# Altium footprint library PCB_Lib_Devzone.PcbLib: 491 footprints (part 26 of 31)
Each footprint in its own frame and in the unit in brackets; x right, y up, seen from the top. Pads: shape width x height; smd on the part's side, far side on the other; paste and mask are expansions set on the pad; w line width, h text height; cw(c..) or ccw(c..) is an arc to the next point about the centre after c.
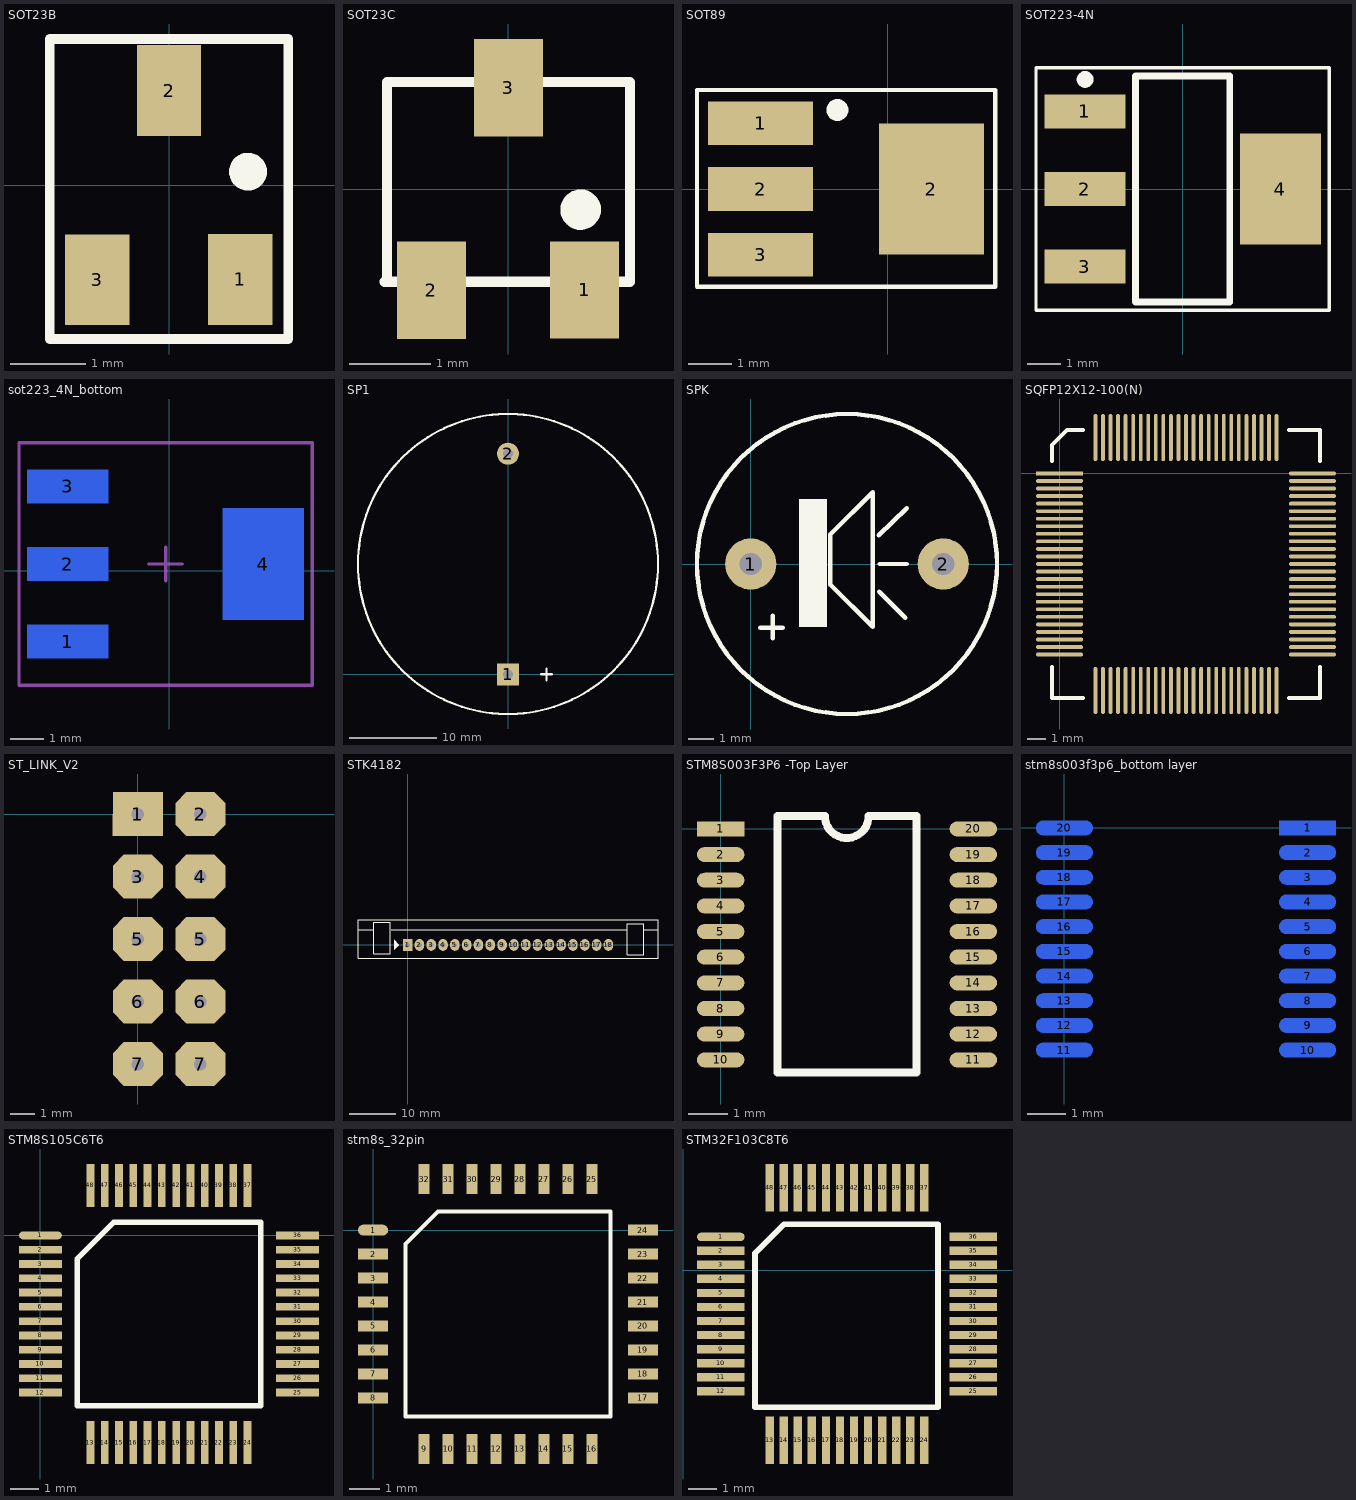
[diagram p25: the footprints below, top view; thin cyan lines are the x and y axes]

## SOT23B [mm] "SOT 23B"
height 1.27
pads (3):
  rect 0.85x1.2 smd: 1(0.94,-1.245) 2(0,1.25) 3(-0.95,-1.25)
Top Overlay:
  circle w0.25: c1.043,0.178 r0.125
  lines w0.127: -1.575,-2.032 1.575,-2.032 1.575,1.93 -1.575,1.93 -1.575,-2.032
3D body "SW3DPS-SOT-23-DEFAULT.STEP": height 1.06, standoff -0.04, extent -1.5,-1.301 1.5,1.199

## SOT23C [mm] "SOT 23C - 2-3-1 - BCE"
height 1.27
pads (3):
  rect 0.85x1.2 smd: 1(0.94,-1.245) 2(-0.95,-1.25) 3(0,1.25)
Top Overlay:
  circle w0.25: c0.891,-0.254 r0.125
  lines w0.127: -1.524,-1.143 1.499,-1.143 1.499,1.321 -1.499,1.321 -1.499,-1.143 -1.524,-1.143
3D body "SW3DPS-SOT-23-DEFAULT.STEP": height 1.06, standoff -0.04, extent -1.5,-1.174 1.5,1.326

## SOT89 [mm] "D882 SOT89 TRANS NPN 3A 30V (SMD)"
pads (4):
  rect 2.4x1 smd: 1(-2.9,1.5) 2(-2.9,0) 3(-2.9,-1.5)
  rect 2.4x3 smd: 2(1,0)
Top Overlay:
  circle w0.25: c-1.143,1.803 r0.125
  lines w0.1: -4.35,-2.235 -4.35,2.261 2.464,2.261 2.464,-2.235 -4.35,-2.235
3D body "User Library-SOT89-3.STEP": height 1.54, standoff 0, extent -2.921,-2.25 1.329,2.25

## SOT223-4N [mm] "SOT223, 4-Leads, Body 6.5x3.5mm, Pitch 2.3mm, Lead Span 7mm, IPC Medium Density"
height 1.8
pads (4):
  rect 2.4x1 smd: 1(-2.9,2.3) 2(-2.9,0) 3(-2.9,-2.3)
  rect 2.4x3.3 smd: 4(2.9,0)
Top Overlay:
  circle w0.25: c-2.894,3.251 r0.125
  lines w0.1: -4.35,-3.6 4.35,-3.6 4.35,3.6 -4.35,3.6 -4.35,-3.6
  lines w0.2: -1.4,-3.35 -1.4,3.35 1.4,3.35 1.4,-3.35 -1.4,-3.35
3D body "SW3dPS-Regulator.STEP": height 1.72, standoff 0.02, extent -3.395,-3.274 3.496,3.226

## sot223_4N_bottom [mm]
pads (4):
  rect 2.4x1 smd far side: 1(-3.002,-2.097) 2(-3.002,0.203) 3(-3.002,2.503)
  rect 2.4x3.3 smd far side: 4(2.798,0.203)
Bottom Overlay:
  circle w0.25: c-3.859,-2.997 r0.125
  lines w0.2: -1.502,-3.147 -1.502,3.553 1.298,3.553 1.298,-3.147 -1.502,-3.147
Mechanical 15:
  lines w0.1: -0.602,0.203 0.398,0.203 ; -0.102,-0.297 -0.102,0.703 ; -4.452,-3.397 -4.452,3.803 4.248,3.803 4.248,-3.397 -4.452,-3.397
3D body "SW3dPS-Regulator.STEP": height -0.53, standoff -2.23, extent -3.496,-2.997 3.395,3.503

## SP1 [mil] "Speaker Telphone on Broad"
height 3
pads (2):
  rect 100x100 hole 45: 1(0,0)
  round 100 hole 45: 2(0,1000)
Top Overlay:
  circle w10: c0,500 r680
  lines w10: 150,0 200,0 ; 174,-28 174,26
3D body "Sonitron-SCS-32 p10-DEFAULT.STEP": height 382.53, standoff -227.75, extent -666.7,-174.54 652.2,1144.36

## SPK [mil] "Speaker Chip"
height 500
pads (2):
  round 80 hole 35: 1(0,0) 2(300,0)
Top Overlay:
  circle w7: c150,0 r233.73
  rectangle: 75,-98 119,101
  lines w7: 15,-99 50,-99 ; 34,-116 34,-81 ; 199.52,44.52 243,87 ; 200,-43 241,-84 ; 201,0 243,0 ; 124,-32 190,-98 190,112 124,46 124,-32
3D body "Sonitron-SCS-17 P10-DEFAULT.STEP": height 343.51, standoff -267.12, extent -221,-354.14 511.28,378.14

## SQFP12X12-100(N) [mm]
pads (100):
  rect 2.5x0.2 smd: 1(0,0)
  oval 2.5x0.2 smd: 2(0,-0.4) 3(0,-0.8) 4(0,-1.2) 5(0,-1.6) 6(0,-2) 7(0,-2.4) 8(0,-2.8) 9(0,-3.2) 10(0,-3.6) 11(0,-4) 12(0,-4.4) 13(0,-4.8) 14(0,-5.2) 15(0,-5.6) 16(0,-6) 17(0,-6.4) 18(0,-6.8) 19(0,-7.2) 20(0,-7.6) 21(0,-8) 22(0,-8.4) 23(0,-8.8) 24(0,-9.2) 25(0,-9.6) 51(13.4,-9.6) 52(13.4,-9.2) 53(13.4,-8.8) 54(13.4,-8.4) 55(13.4,-8) 56(13.4,-7.6) 57(13.4,-7.2) 58(13.4,-6.8) 59(13.4,-6.4) 60(13.4,-6) 61(13.4,-5.6) 62(13.4,-5.2) 63(13.4,-4.8) 64(13.4,-4.4) 65(13.4,-4) 66(13.4,-3.6) 67(13.4,-3.2) 68(13.4,-2.8) 69(13.4,-2.4) 70(13.4,-2) 71(13.4,-1.6) 72(13.4,-1.2) 73(13.4,-0.8) 74(13.4,-0.4) 75(13.4,0)
  oval 0.2x2.5 smd: 26(1.9,-11.5) 27(2.3,-11.5) 28(2.7,-11.5) 29(3.1,-11.5) 30(3.5,-11.5) 31(3.9,-11.5) 32(4.3,-11.5) 33(4.7,-11.5) 34(5.1,-11.5) 35(5.5,-11.5) 36(5.9,-11.5) 37(6.3,-11.5) 38(6.7,-11.5) 39(7.1,-11.5) 40(7.5,-11.5) 41(7.9,-11.5) 42(8.3,-11.5) 43(8.7,-11.5) 44(9.1,-11.5) 45(9.5,-11.5) 46(9.9,-11.5) 47(10.3,-11.5) 48(10.7,-11.5) 49(11.1,-11.5) 50(11.5,-11.5) 76(11.5,1.9) 77(11.1,1.9) 78(10.7,1.9) 79(10.3,1.9) 80(9.9,1.9) 81(9.5,1.9) 82(9.1,1.9) 83(8.7,1.9) 84(8.3,1.9) 85(7.9,1.9) 86(7.5,1.9) 87(7.1,1.9) 88(6.7,1.9) 89(6.3,1.9) 90(5.9,1.9) 91(5.5,1.9) 92(5.1,1.9) 93(4.7,1.9) 94(4.3,1.9) 95(3.9,1.9) 96(3.5,1.9) 97(3.1,1.9) 98(2.7,1.9) 99(2.3,1.9) 100(1.9,1.9)
Top Overlay:
  lines w0.2: -0.4,-10.25 -0.4,-11.9 1.25,-11.9 ; -0.4,0.65 -0.4,1.5 0.4,2.3 1.25,2.3 ; 12.15,-11.9 13.8,-11.9 13.8,-10.25 ; 12.15,2.3 13.8,2.3 13.8,0.65

## ST_LINK_V2 [mil]
pads (10):
  rect 80x70 hole 20: 1(0,0)
  oct 80x70 hole 20: 2(100,0) 3(0,-100) 4(100,-100) 5(0,-200) 5(100,-200) 6(0,-300) 6(100,-300) 7(0,-400) 7(100,-400)
3D body "User Library-IDC Socket Male 10pin Straight THT Goldplated 2_54mm.STEP": height 361.02, standoff -127.17, extent -118.42,-597.61 230,201.61

## STK4182 [mil] "Pin to pin 100mil, 18 pin"
pads (18):
  rect 80x100 hole 40: 1(0,0)
  oval 80x100 hole 40: 2(100,0) 3(200,0) 4(300,0) 5(400,0) 6(500,0) 7(600,0) 8(700,0) 9(800,0) 10(900,0) 11(1000,0) 12(1100,0) 13(1200,0) 14(1300,0) 15(1400,0) 16(1500,0) 17(1600,0) 18(1700,0)
Top Overlay:
  region: -115,42.5 -115,-42.5 -75,-2.5 -75,2.5
  lines w10: -420,130 -285,130 ; -140,130 1860,130 ; 2000,130 2120,130 ; -420,-115 -420,215 2120,215 2120,-115 -420,-115 ; -285,-75 -145,-75 -145,190 -285,190 -285,-75 ; 1860,-85 1860,180 2000,180 2000,-85 1860,-85

## STM8S003F3P6 -Top Layer [mm]
pads (20):
  rect 1.2x0.381 smd: 1(0,0)
  oval 1.2x0.381 smd: 2(0,-0.65) 3(0,-1.3) 4(0,-1.95) 5(0,-2.6) 6(0,-3.25) 7(0,-3.9) 8(0,-4.55) 9(0,-5.2) 10(0,-5.85) 11(6.4,-5.85) 12(6.4,-5.2) 13(6.4,-4.55) 14(6.4,-3.9) 15(6.4,-3.25) 16(6.4,-2.6) 17(6.4,-1.95) 18(6.4,-1.3) 19(6.4,-0.65) 20(6.4,0)
Top Overlay:
  lines w0.2: 3.744,0.324 cw(c3.193,0.32) 2.642,0.325 1.435,0.325 1.435,-6.175 4.965,-6.175 4.965,0.325 3.744,0.325
3D body "User Library-TSSOP20-TP.STEP": height 1.2, standoff 0, extent -0.051,-6.223 6.499,0.377

## stm8s003f3p6_bottom layer [mm]
pads (20):
  rect 1.5x0.381 smd far side: 1(6.4,0)
  oval 1.5x0.381 smd far side: 2(6.4,-0.65) 3(6.4,-1.3) 4(6.4,-1.95) 5(6.4,-2.6) 6(6.4,-3.25) 7(6.4,-3.9) 8(6.4,-4.55) 9(6.4,-5.2) 10(6.4,-5.85) 11(0,-5.85) 12(0,-5.2) 13(0,-4.55) 14(0,-3.9) 15(0,-3.25) 16(0,-2.6) 17(0,-1.95) 18(0,-1.3) 19(0,-0.65) 20(0,0)
Bottom Overlay:
  lines w0.1: 1.485,-6.175 1.485,0.325 2.798,0.325 ccw(c3.203,0.327) 3.607,0.325 4.915,0.325 4.915,-6.175 1.485,-6.175
3D body "User Library-TSSOP20-TP.STEP": height -0.46, standoff -1.66, extent -0.049,-6.219 6.501,0.381

## STM8S103K3T6 [mil] "32-Pin Plastic Thin Quad Flat Pack (TFQP)"
height 47.24

## STM8S105C6T6 [mm]
pads (48):
  oval 1.5x0.27 smd: 1(0,0)
  rect 1.5x0.27 smd: 2(0,-0.5) 3(0,-1) 4(0,-1.5) 5(0,-2) 6(0,-2.5) 7(0,-3) 8(0,-3.5) 9(0,-4) 10(0,-4.5) 11(0,-5) 12(0,-5.5) 25(9,-5.5) 26(9,-5) 27(9,-4.5) 28(9,-4) 29(9,-3.5) 30(9,-3) 31(9,-2.5) 32(9,-2) 33(9,-1.5) 34(9,-1) 35(9,-0.5) 36(9,0)
  rect 0.27x1.5 smd: 13(1.75,-7.25) 14(2.25,-7.25) 15(2.75,-7.25) 16(3.25,-7.25) 17(3.75,-7.25) 18(4.25,-7.25) 19(4.75,-7.25) 20(5.25,-7.25) 21(5.75,-7.25) 22(6.25,-7.25) 23(6.75,-7.25) 24(7.25,-7.25) 37(7.25,1.75) 38(6.75,1.75) 39(6.25,1.75) 40(5.75,1.75) 41(5.25,1.75) 42(4.75,1.75) 43(4.25,1.75) 44(3.75,1.75) 45(3.25,1.75) 46(2.75,1.75) 47(2.25,1.75) 48(1.75,1.75)
Top Overlay:
  lines w0.2: 1.285,-5.965 7.715,-5.965 7.715,0.465 2.57,0.465 1.285,-0.82 1.285,-5.965
3D body "SW3dPS-LQFP48.STEP": height 1.5, standoff 0, extent -0.004,-7.243 8.996,1.757

## stm8s_32pin [mil]
pads (32):
  oval 39x14 smd: 1(0,0)
  rect 39x14 smd: 2(0,-31) 3(0,-62) 4(0,-93) 5(0,-124) 6(0,-155) 7(0,-186) 8(0,-217) 17(349,-217) 18(349,-186) 19(349,-155) 20(349,-124) 21(349,-93) 22(349,-62) 23(349,-31) 24(349,0)
  rect 14x39 smd: 9(66,-283) 10(97,-283) 11(128,-283) 12(159,-283) 13(190,-283) 14(221,-283) 15(252,-283) 16(283,-283) 25(283,66) 26(252,66) 27(221,66) 28(190,66) 29(159,66) 30(128,66) 31(97,66) 32(66,66)
Top Overlay:
  lines w5: 42,-241 307,-241 307,24 84,24 42,-18 42,-241
3D body "User Library-lqfp32-1.STEP": height 59.06, standoff 0.79, extent -2.16,-286.16 352.17,68.17

## STM32F103C8T6 [mm]
pads (48):
  oval 1.7x0.3 smd: 1(1.346,1.194)
  rect 1.7x0.3 smd: 2(1.346,0.694) 3(1.346,0.194) 4(1.346,-0.306) 5(1.346,-0.806) 6(1.346,-1.306) 7(1.346,-1.806) 8(1.346,-2.306) 9(1.346,-2.806) 10(1.346,-3.306) 11(1.346,-3.806) 12(1.346,-4.306) 25(10.346,-4.306) 26(10.346,-3.806) 27(10.346,-3.306) 28(10.346,-2.806) 29(10.346,-2.306) 30(10.346,-1.806) 31(10.346,-1.306) 32(10.346,-0.806) 33(10.346,-0.306) 34(10.346,0.194) 35(10.346,0.694) 36(10.346,1.194)
  rect 0.3x1.7 smd: 13(3.096,-6.056) 14(3.596,-6.056) 15(4.096,-6.056) 16(4.596,-6.056) 17(5.096,-6.056) 18(5.596,-6.056) 19(6.096,-6.056) 20(6.596,-6.056) 21(7.096,-6.056) 22(7.596,-6.056) 23(8.096,-6.056) 24(8.596,-6.056) 37(8.596,2.944) 38(8.096,2.944) 39(7.596,2.944) 40(7.096,2.944) 41(6.596,2.944) 42(6.096,2.944) 43(5.596,2.944) 44(5.096,2.944) 45(4.596,2.944) 46(4.096,2.944) 47(3.596,2.944) 48(3.096,2.944)
Top Overlay:
  lines w0.2: 2.565,-4.877 9.093,-4.877 9.093,1.651 3.607,1.651 2.565,0.61 2.565,-4.877
3D body "SW3dPS-LQFP48.STEP": height 1.5, standoff 0, extent 1.418,-6.075 10.418,2.925